# Altium footprint library PHANTOM_FOOTPRINTS.PcbLib: 49 footprints (part 3 of 4)
Each footprint in its own frame and in the unit in brackets; x right, y up, seen from the top. Pads: shape width x height; smd on the part's side, far side on the other; paste and mask are expansions set on the pad; w line width, h text height; cw(c..) or ccw(c..) is an arc to the next point about the centre after c.
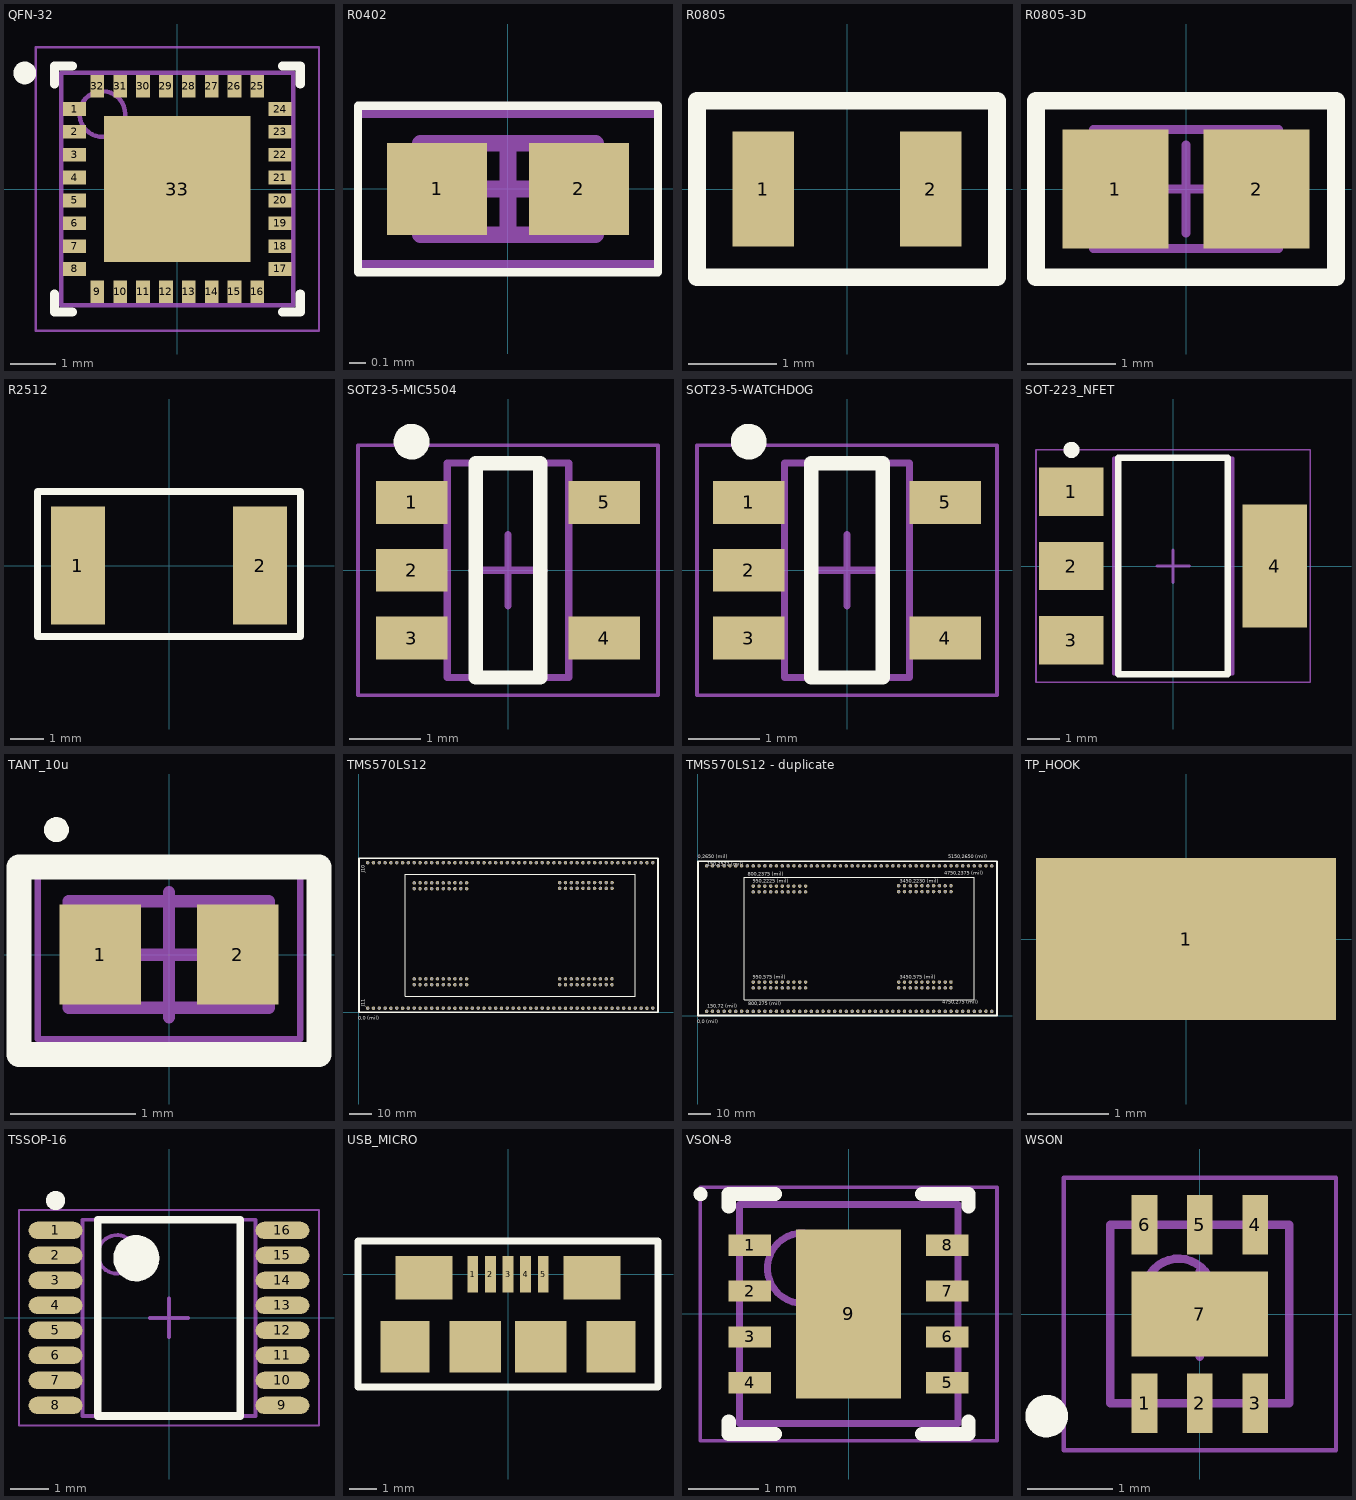
[diagram p2: the footprints below, top view; thin cyan lines are the x and y axes]

## QFN-32 [mm] "QFN, 32-Leads, Body 5.00x5.00mm, Pitch 0.50mm, Thermal Pad 3.20x3.20mm, IPC Medium Density"
height 0.6
pads (33):
  rect 0.5x0.3 smd: 1(-2.25,1.75) 2(-2.25,1.25) 3(-2.25,0.75) 4(-2.25,0.25) 5(-2.25,-0.25) 6(-2.25,-0.75) 7(-2.25,-1.25) 8(-2.25,-1.75) 17(2.25,-1.75) 18(2.25,-1.25) 19(2.25,-0.75) 20(2.25,-0.25) 21(2.25,0.25) 22(2.25,0.75) 23(2.25,1.25) 24(2.25,1.75)
  rect 0.3x0.5 smd: 9(-1.75,-2.25) 10(-1.25,-2.25) 11(-0.75,-2.25) 12(-0.25,-2.25) 13(0.25,-2.25) 14(0.75,-2.25) 15(1.25,-2.25) 16(1.75,-2.25) 25(1.75,2.25) 26(1.25,2.25) 27(0.75,2.25) 28(0.25,2.25) 29(-0.25,2.25) 30(-0.75,2.25) 31(-1.25,2.25) 32(-1.75,2.25)
  rect 3.2x3.2 smd: 33(0,0)
Top Overlay:
  circle w0.25: c-3.34,2.54 r0.125
  lines w0.2: -2.69,-2.3 -2.69,-2.69 -2.3,-2.69 ; -2.69,2.3 -2.69,2.69 -2.3,2.69 ; 2.3,-2.69 2.69,-2.69 2.69,-2.3 ; 2.3,2.69 2.69,2.69 2.69,2.3
Mechanical 13:
  circle w0.1: c-1.64,1.64 r0.5
  lines w0.1: -2.54,-2.54 2.54,-2.54 2.54,2.54 -2.54,2.54 -2.54,-2.54
Mechanical 15:
  lines w0.05: -3.1,-3.1 3.1,-3.1 3.1,3.1 -3.1,3.1 -3.1,-3.1
  lines w0.1: -0.5,0 0.5,0 ; 0,-0.5 0,0.5
3D body "QFN50P500X500X60_HS-33N.step": height 0.6, standoff 0, extent -2.59,-2.59 2.59,2.59

## R0402 [mm] "Chip Resistor, 2-Leads, Body 1.00x0.50mm, IPC Medium Density"
height 0.4
pads (2):
  rect 0.6x0.55 smd: 1(-0.425,0) 2(0.425,0)
Top Overlay:
  lines w0.05: -0.9,-0.5 0.9,-0.5 0.9,0.5 -0.9,0.5 -0.9,-0.5
Mechanical 13:
  lines w0.1: -0.525,-0.275 0.525,-0.275 0.525,0.275 -0.525,0.275 -0.525,-0.275
Mechanical 15:
  lines w0.05: -0.9,-0.45 0.9,-0.45 0.9,0.45 -0.9,0.45 -0.9,-0.45
  lines w0.1: -0.275,0 0.275,0 ; 0,-0.275 0,0.275
3D body "RESC1005X04N.step": height 0.4, standoff 0, extent -0.525,-0.275 0.525,0.275

## R0805 [mm]
pads (2):
  rect 0.7x1.3 smd: 1(-0.95,0) 2(0.95,0)
Top Overlay:
  lines w0.2: -1.7,-1 1.7,-1 1.7,1 -1.7,1 -1.7,-1

## R0805-3D [mm] "Chip Resistor, 2-Leads, Body 2.00x1.25mm, IPC Medium Density"
height 0.9
pads (2):
  rect 1.2x1.35 smd: 1(-0.8,0) 2(0.8,0)
Top Overlay:
  lines w0.2: -1.7,-1 -1.7,1 1.7,1 1.7,-1 -1.7,-1
Mechanical 13:
  lines w0.1: -1.05,-0.675 1.05,-0.675 1.05,0.675 -1.05,0.675 -1.05,-0.675
Mechanical 15:
  lines w0.05: -1.65,-0.95 1.65,-0.95 1.65,0.95 -1.65,0.95 -1.65,-0.95
  lines w0.1: -0.5,0 0.5,0 ; 0,-0.5 0,0.5
3D body "RESC2012X09N.step": height 0.9, standoff 0, extent -1.05,-0.675 1.05,0.675

## R2512 [mm]
pads (2):
  rect 1.6x3.5 smd: 1(-2.7,0) 2(2.7,0)
Top Overlay:
  lines w0.2: -3.9,-2.1 3.9,-2.1 3.9,2.2 -3.9,2.2 -3.9,-2.1

## SOT23-5-MIC5504 [mm] "SOT23, 5-Leads, Body 2.90x2.80mm, Pitch 0.95mm, IPC Medium Density"
height 1.45
pads (5):
  rect 1x0.6 smd: 1(-1.35,0.95) 2(-1.35,0) 3(-1.35,-0.95) 4(1.35,-0.95) 5(1.35,0.95)
Top Overlay:
  circle w0.25: c-1.35,1.8 r0.125
  lines w0.2: -0.45,-1.5 0.45,-1.5 0.45,1.5 -0.45,1.5 -0.45,-1.5
Mechanical 13:
  lines w0.1: -0.85,-1.5 -0.85,1.5 0.85,1.5 0.85,-1.5 -0.85,-1.5
Mechanical 15:
  lines w0.05: -2.1,-1.75 -2.1,1.75 2.1,1.75 2.1,-1.75 -2.1,-1.75
  lines w0.1: -0.5,0 0.5,0 ; 0,-0.5 0,0.5
3D body "SOT23-5-MIC5504.step": height 1.45, standoff 0, extent -1.5,-1.5 1.5,1.5

## SOT23-5-WATCHDOG [mm] "SOT23, 5-Leads, Body 2.90x2.80mm, Pitch 0.95mm, IPC Medium Density"
height 1.45
pads (5):
  rect 1x0.6 smd: 1(-1.375,0.95) 2(-1.375,0) 3(-1.375,-0.95) 4(1.375,-0.95) 5(1.375,0.95)
Top Overlay:
  circle w0.25: c-1.375,1.8 r0.125
  lines w0.2: -0.5,-1.5 0.5,-1.5 0.5,1.5 -0.5,1.5 -0.5,-1.5
Mechanical 13:
  lines w0.1: -0.875,-1.5 -0.875,1.5 0.875,1.5 0.875,-1.5 -0.875,-1.5
Mechanical 15:
  lines w0.05: -2.1,-1.75 -2.1,1.75 2.1,1.75 2.1,-1.75 -2.1,-1.75
  lines w0.1: -0.5,0 0.5,0 ; 0,-0.5 0,0.5
3D body "SOT95P280X145-5N.step": height 1.45, standoff 0, extent -1.6,-1.5 1.6,1.5

## SOT-223_NFET [mm] "SOT223, 4-Leads, Body 6.50x7.00mm (avg), Pitch 2.30mm, IPC Medium Density"
height 1.63
pads (4):
  rect 2x1.5 smd: 1(-3.15,2.3) 2(-3.15,0) 3(-3.15,-2.3)
  rect 2x3.8 smd: 4(3.15,0)
Top Overlay:
  circle w0.25: c-3.15,3.6 r0.125
  lines w0.2: -1.7,-3.35 1.7,-3.35 1.7,3.35 -1.7,3.35 -1.7,-3.35
Mechanical 13:
  lines w0.1: -1.85,-3.35 1.85,-3.35 1.85,3.35 -1.85,3.35 -1.85,-3.35
Mechanical 15:
  lines w0.05: -4.25,-3.6 4.25,-3.6 4.25,3.6 -4.25,3.6 -4.25,-3.6
  lines w0.1: -0.5,0 0.5,0 ; 0,-0.5 0,0.5
3D body: height 1.63, standoff 0.02, extent -1.85,-3.35 1.85,3.35

## TANT_10u [mm] "DFN, 2-Leads, Body 0.85x1.60mm, Pitch 1.10mm, IPC Medium Density"
height 0.9
pads (2):
  rect 0.65x0.8 smd: 1(-0.55,0) 2(0.55,0)
Top Overlay:
  circle w0.1: c-0.9,1 r0.05
  lines w0.2: -1.2,-0.8 1.2,-0.8 1.2,0.7 -1.2,0.7 -1.2,-0.8
Mechanical 13:
  lines w0.1: -0.8,-0.425 -0.8,0.425 0.8,0.425 0.8,-0.425 -0.8,-0.425
Mechanical 15:
  lines w0.05: -1.05,-0.675 -1.05,0.675 1.05,0.675 1.05,-0.675 -1.05,-0.675
  lines w0.1: -0.5,0 0.5,0 ; 0,-0.5 0,0.5
3D body "DFN110P160X90-2N.step": height 0.9, standoff 0, extent -0.85,-0.425 0.85,0.425

## TMS570LS12 [mil] "Hercules LaunchPad"
pads (180):
  round 60 hole 40: 1(150,2572) 2(250,2572) 3(350,2572) 4(450,2572) 5(550,2572) 6(650,2572) 7(750,2572) 8(850,2572) 9(950,2572) 10(1050,2572) 11(1150,2572) 12(1250,2572) 13(1350,2572) 14(1450,2572) 15(1550,2572) 16(1650,2572) 17(1750,2572) 18(1850,2572) 19(1950,2572) 20(2050,2572) 21(2150,2572) 22(2250,2572) 23(2350,2572) 24(2450,2572) 25(2550,2572) 26(2650,2572) 27(2750,2572) 28(2850,2572) 29(2950,2572) 30(3050,2572) 31(3150,2572) 32(3250,2572) 33(3350,2572) 34(3450,2572) 35(3550,2572) 36(3650,2572) 37(3750,2572) 38(3850,2572) 39(3950,2572) 40(4050,2572) 41(4150,2572) 42(4250,2572) 43(4350,2572) 44(4450,2572) 45(4550,2572) 46(4650,2572) 47(4750,2572) 48(4850,2572) 49(4950,2572) 50(5050,2572) 51(950,2225) 52(1050,2225) 53(1150,2225) 54(1250,2225) 55(1350,2225) 56(1450,2225) 57(1550,2225) 58(1650,2225) 59(1750,2225) 60(1850,2225) 61(950,2125) 62(1050,2125) 63(1150,2125) 64(1250,2125) 65(1350,2125) 66(1450,2125) 67(1550,2125) 68(1650,2125) 69(1750,2125) 70(1850,2125) 71(3450,2230) 72(3550,2230) 73(3650,2230) 74(3750,2230) 75(3850,2230) 76(3950,2230) 77(4050,2230) 78(4150,2230) 79(4250,2230) 80(4350,2230) 81(3450,2130) 82(3550,2130) 83(3650,2130) 84(3750,2130) 85(3850,2130) 86(3950,2130) 87(4050,2130) 88(4150,2130) 89(4250,2130) 90(4350,2130) 91(950,575) 92(1050,575) 93(1150,575) 95(1350,575) 96(1450,575) 97(1550,575) 98(1650,575) 99(1750,575) 100(1850,575) 101(950,475) 102(1050,475) 103(1150,475) 104(1250,475) 105(1350,475) 106(1450,475) 107(1550,475) 108(1650,475) 109(1750,475) 110(1850,475) 111(3450,575) 112(3550,575) 113(3650,575) 114(3750,575) 115(3850,575) 116(3950,575) 117(4050,575) 118(4150,575) 119(4250,575) 120(4349,576) 121(3450,475) 122(3550,475) 123(3650,475) 124(3750,475) 125(3850,475) 126(3950,475) 127(4050,475) 128(4150,475) 129(4250,475) 130(4349,476) 131(150,72) 132(250,72) 133(350,72) 134(450,72) 135(550,72) 136(650,72) 137(750,72) 138(850,72) 139(950,72) 140(1050,72) 141(1150,72) 142(1250,72) 143(1350,72) 144(1450,72) 145(1550,72) 146(1650,72) 147(1750,72) 148(1850,72) 149(1950,72) 150(2050,72) 151(2150,72) 152(2250,72) 153(2350,72) 154(2450,72) 155(2550,72) 156(2650,72) 157(2750,72) 158(2850,72) 159(2950,72) 160(3050,72) 161(3150,72) 162(3250,72) 163(3350,72) 164(3450,72) 165(3550,72) 166(3650,72) 167(3750,72) 168(3850,72) 169(3950,72) 170(4050,72) 171(4150,72) 172(4250,72) 173(4350,72) 174(4450,72) 175(4550,72) 176(4650,72) 177(4750,72) 178(4850,72) 179(4950,72) 180(5050,72)
  round 60 hole 40 unplated: 94(1250,575)
Top Layer:
  lines w10: -10,0 10,0 ; -10,2650 10,2650 ; 0,-10 0,10 ; 0,2640 0,2650 ; 140,72 160,72 ; 940,575 960,575 ; 940,2124 960,2124 ; 940,2225 960,2225 ; 950,2114 950,2134 ; 950,2215 950,2235 ; 3450,2220 3450,2240
Top Overlay:
  lines w10: 140,2572 160,2572 ; 150,2562 150,2582 ; 800,275 800,2375 4750,2375 4750,275 800,275
  lines w30: 0,0 0,2650 5140,2650 5140,0 0,0
  text "J11" at 100,100 h60
  text "0,0 (mil)" at -16,-129 h60
  text "J10" at 100,2400 h60
3D body "LAUNCHXL2_TMS57012_RM46.step": height 0, standoff -63.8, extent -6.06,-2.04 5143.93,2647.96

## TMS570LS12 - duplicate [mil] "Hercules LaunchPad"
pads (180):
  round 60 hole 40: 1(150,2572) 2(250,2572) 3(350,2572) 4(450,2572) 5(550,2572) 6(650,2572) 7(750,2572) 8(850,2572) 9(950,2572) 10(1050,2572) 11(1150,2572) 12(1250,2572) 13(1350,2572) 14(1450,2572) 15(1550,2572) 16(1650,2572) 17(1750,2572) 18(1850,2572) 19(1950,2572) 20(2050,2572) 21(2150,2572) 22(2250,2572) 23(2350,2572) 24(2450,2572) 25(2550,2572) 26(2650,2572) 27(2750,2572) 28(2850,2572) 29(2950,2572) 30(3050,2572) 31(3150,2572) 32(3250,2572) 33(3350,2572) 34(3450,2572) 35(3550,2572) 36(3650,2572) 37(3750,2572) 38(3850,2572) 39(3950,2572) 40(4050,2572) 41(4150,2572) 42(4250,2572) 43(4350,2572) 44(4450,2572) 45(4550,2572) 46(4650,2572) 47(4750,2572) 48(4850,2572) 49(4950,2572) 50(5050,2572) 51(950,2225) 52(1050,2225) 53(1150,2225) 54(1250,2225) 55(1350,2225) 56(1450,2225) 57(1550,2225) 58(1650,2225) 59(1750,2225) 60(1850,2225) 61(950,2125) 62(1050,2125) 63(1150,2125) 64(1250,2125) 65(1350,2125) 66(1450,2125) 67(1550,2125) 68(1650,2125) 69(1750,2125) 70(1850,2125) 71(3450,2230) 72(3550,2230) 73(3650,2230) 74(3750,2230) 75(3850,2230) 76(3950,2230) 77(4050,2230) 78(4150,2230) 79(4250,2230) 80(4350,2230) 81(3450,2130) 82(3550,2130) 83(3650,2130) 84(3750,2130) 85(3850,2130) 86(3950,2130) 87(4050,2130) 88(4150,2130) 89(4250,2130) 90(4350,2130) 91(950,575) 92(1050,575) 93(1150,575) 95(1350,575) 96(1450,575) 97(1550,575) 98(1650,575) 99(1750,575) 100(1850,575) 101(950,475) 102(1050,475) 103(1150,475) 104(1250,475) 105(1350,475) 106(1450,475) 107(1550,475) 108(1650,475) 109(1750,475) 110(1850,475) 111(3450,575) 112(3550,575) 113(3650,575) 114(3750,575) 115(3850,575) 116(3950,575) 117(4050,575) 118(4150,575) 119(4250,575) 120(4349,576) 121(3450,475) 122(3550,475) 123(3650,475) 124(3750,475) 125(3850,475) 126(3950,475) 127(4050,475) 128(4150,475) 129(4250,475) 130(4349,476) 131(150,72) 132(250,72) 133(350,72) 134(450,72) 135(550,72) 136(650,72) 137(750,72) 138(850,72) 139(950,72) 140(1050,72) 141(1150,72) 142(1250,72) 143(1350,72) 144(1450,72) 145(1550,72) 146(1650,72) 147(1750,72) 148(1850,72) 149(1950,72) 150(2050,72) 151(2150,72) 152(2250,72) 153(2350,72) 154(2450,72) 155(2550,72) 156(2650,72) 157(2750,72) 158(2850,72) 159(2950,72) 160(3050,72) 161(3150,72) 162(3250,72) 163(3350,72) 164(3450,72) 165(3550,72) 166(3650,72) 167(3750,72) 168(3850,72) 169(3950,72) 170(4050,72) 171(4150,72) 172(4250,72) 173(4350,72) 174(4450,72) 175(4550,72) 176(4650,72) 177(4750,72) 178(4850,72) 179(4950,72) 180(5050,72)
  round 60 hole 40 unplated: 94(1250,575)
Top Layer:
  lines w10: -10,0 10,0 ; -10,2650 10,2650 ; 0,-10 0,10 ; 0,2640 0,2650 ; 140,72 160,72 ; 940,575 960,575 ; 940,2124 960,2124 ; 940,2225 960,2225 ; 950,2114 950,2134 ; 950,2215 950,2235 ; 3450,2220 3450,2240
Top Overlay:
  lines w10: 140,2572 160,2572 ; 150,2562 150,2582 ; 800,275 4750,275 4750,2375 800,2375 800,275
  lines w30: 0,0 5140,0 5140,2650 0,2650 0,0
  text "3450,2230 (mil)" at 3464.57,2283.46 h60
  text "950,2225 (mil)" at 944.88,2283.46 h60
  text "950,575 (mil)" at 944.88,629.92 h60
  text "3450,575 (mil)" at 3464.57,629.92 h60
  text "800,275 (mil)" at 868,181 h60
  text "800,2375 (mil)" at 852,2401 h60
  text "4750,275 (mil)" at 4200,200 h60
  text "4750,2375 (mil)" at 4235,2417 h60
  text "5150,2650 (mil)" at 4300,2700 h60
  text "0,2650 (mil)" at 0,2700 h60
  text "0,0 (mil)" at -16,-129 h60
  text "150,72 (mil)" at 157.48,137.8 h60
  text "150,2572 (mil)" at 160,2572 h60
3D body "LAUNCHXL2_TMS57012_RM46.step": height 0, standoff -63.8, extent -6.06,-2.04 5143.93,2647.96

## TP_HOOK [mm]
pads (1):
  rect 3.7x2 smd: 1(0,0)
3D body "keystone-PN5015.STEP": height 1.52, standoff 0, extent -1.562,-0.508 1.562,0.508

## TSSOP-16 [mm] "TSOP, 16-Leads, Body 5.00x4.40mm, Pitch 0.65mm, IPC Medium Density"
height 1.1
pads (16):
  oval 1.4x0.45 smd: 1(-2.95,2.275) 2(-2.95,1.625) 3(-2.95,0.975) 4(-2.95,0.325) 5(-2.95,-0.325) 6(-2.95,-0.975) 7(-2.95,-1.625) 8(-2.95,-2.275) 9(2.95,-2.275) 10(2.95,-1.625) 11(2.95,-0.975) 12(2.95,-0.325) 13(2.95,0.325) 14(2.95,0.975) 15(2.95,1.625) 16(2.95,2.275)
Top Overlay:
  circle w0.25: c-2.95,3.05 r0.125
  circle w0.6: c-0.85,1.55 r0.3
  lines w0.2: -1.85,-2.55 -1.85,2.55 1.85,2.55 1.85,-2.55 -1.85,-2.55
Mechanical 13:
  circle w0.1: c-1.35,1.65 r0.5
  lines w0.1: -2.25,-2.55 -2.25,2.55 2.25,2.55 2.25,-2.55 -2.25,-2.55
Mechanical 15:
  lines w0.05: -3.9,-2.8 -3.9,2.8 3.9,2.8 3.9,-2.8 -3.9,-2.8
  lines w0.1: -0.5,0 0.5,0 ; 0,-0.5 0,0.5
3D body "TSSOP-16.step": height 1.1, standoff 0, extent -3.2,-2.55 3.2,2.55

## USB_MICRO [mm]
pads (11):
  rect 0.4x1.35 smd: 1(-1.3,0) 3(0,0) 4(0.65,0) 5(1.3,0)
  rect 0.4x1.355 smd: 2(-0.65,0)
  rect 1.8x1.9 smd: ""(-3.8,-2.675) ""(3.8,-2.675)
  rect 2.1x1.6 smd: ""(-3.1,-0.125) ""(3.1,-0.125)
  rect 1.9x1.9 smd: ""(-1.2,-2.675) ""(1.2,-2.675)
Top Overlay:
  lines w0.254: -5.525,-4.15 -5.525,1.225 5.525,1.225 5.525,-4.15 -5.525,-4.15
3D body "micro_usb.stp": height 2.74, standoff -0.27, extent -3.956,-5.31 3.956,0.35

## VSON-8 [mm] "SON, 8-Leads, Body 3.00x3.00mm, Pitch 0.65mm, Thermal Pad 2.40x1.49mm, IPC Medium Density"
height 1
pads (9):
  rect 0.6x0.3 smd: 1(-1.4,0.975) 2(-1.4,0.325) 3(-1.4,-0.325) 4(-1.4,-0.975) 5(1.4,-0.975) 6(1.4,-0.325) 7(1.4,0.325) 8(1.4,0.975)
  rect 1.49x2.4 smd: 9(0,0)
Top Overlay:
  circle w0.1: c-2.1,1.7 r0.05
  lines w0.2: -1.7,-1.525 -1.7,-1.7 -1.045,-1.7 ; -1.7,1.525 -1.7,1.7 -1.045,1.7 ; 1.045,-1.7 1.7,-1.7 1.7,-1.525 ; 1.045,1.7 1.7,1.7 1.7,1.525
Mechanical 13:
  circle w0.1: c-0.65,0.65 r0.5
  lines w0.1: -1.55,-1.55 -1.55,1.55 1.55,1.55 1.55,-1.55 -1.55,-1.55
Mechanical 15:
  lines w0.05: -2.105,-1.8 -2.105,1.8 2.105,1.8 2.105,-1.8 -2.105,-1.8
  lines w0.1: -0.5,0 0.5,0 ; 0,-0.5 0,0.5
3D body "SON65P300X100_HS-9N.step": height 1, standoff 0, extent -1.6,-1.55 1.6,1.55

## WSON [mm] "QFN, 6-Leads, Body 2.00x2.00mm, Pitch 0.65mm, Thermal Pad 1.60x1.00mm, IPC Medium Density"
height 0.8
pads (7):
  rect 0.3x0.7 smd: 1(-0.65,-1.05) 2(0,-1.05) 3(0.65,-1.05) 4(0.65,1.05) 5(0,1.05) 6(-0.65,1.05)
  rect 1.6x1 smd: 7(0,0)
Top Overlay:
  circle w0.25: c-1.8,-1.2 r0.125
Mechanical 13:
  circle w0.1: c-0.25,0.25 r0.4
  lines w0.1: -1.05,-1.05 -1.05,1.05 1.05,1.05 1.05,-1.05 -1.05,-1.05
Mechanical 15:
  lines w0.05: -1.6,-1.6 -1.6,1.6 1.6,1.6 1.6,-1.6 -1.6,-1.6
  lines w0.1: -0.5,0 0.5,0 ; 0,-0.5 0,0.5
3D body: height 0.8, standoff 0, extent -1.05,-1.05 1.05,1.05